# Altium schematic symbol library Library.SchLib: 802 symbols (part 4 of 8) (continued)
## EP1C6-TQFP240A (continued)
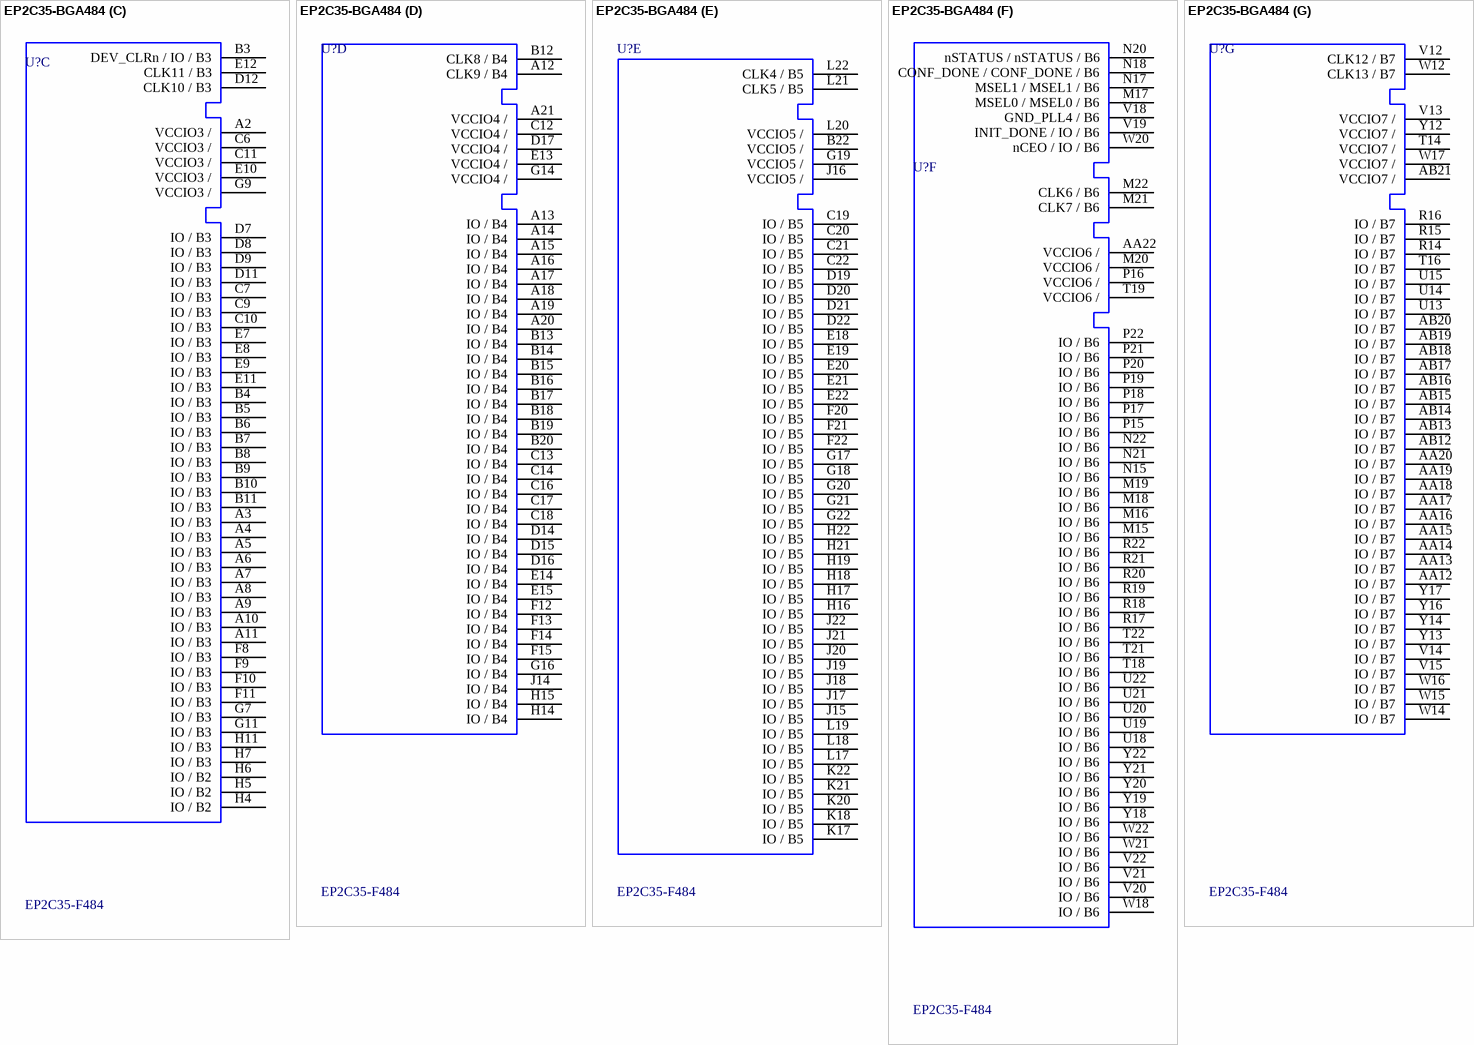
[diagram p26: symbol EP2C35-BGA484]
text: ALTERA; Cyclone

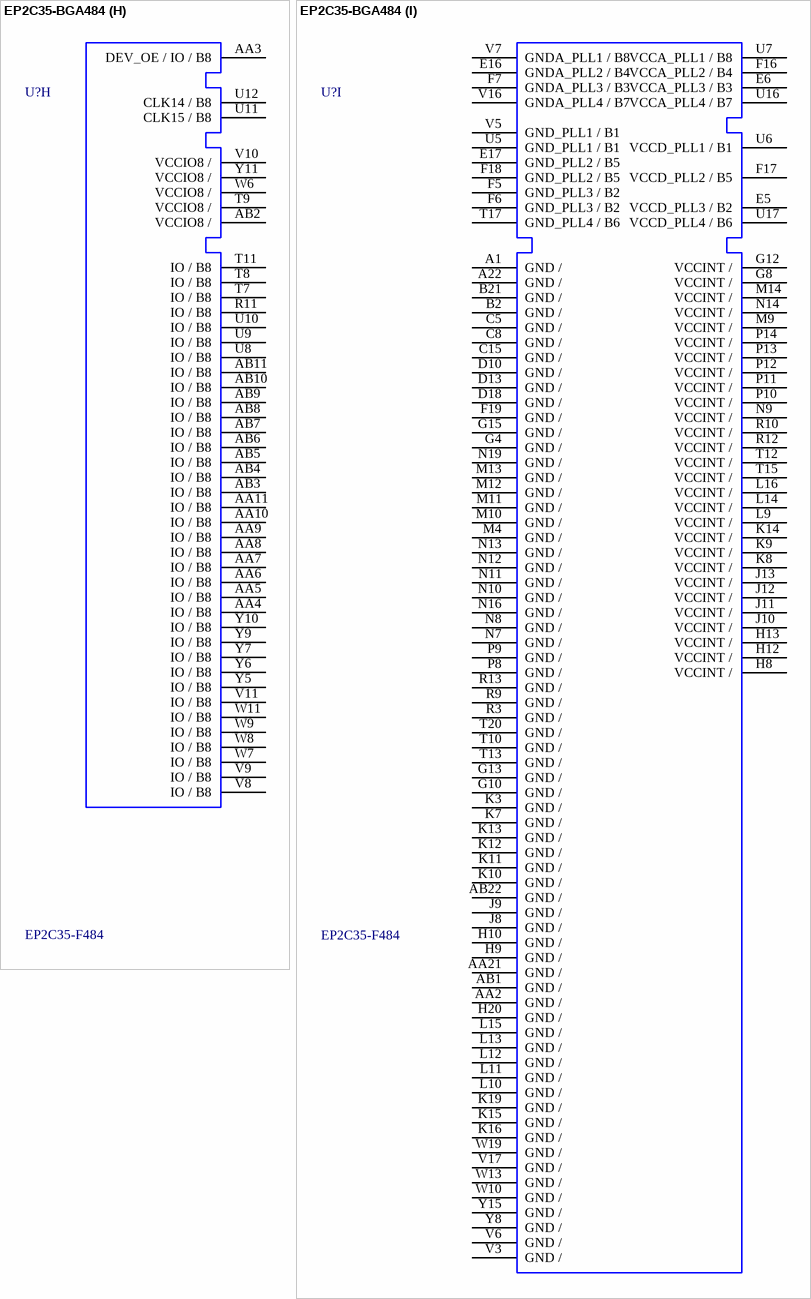
[diagram p27: symbol EP2C35-BGA484]

## EP2C35-BGA484
designator U?, comment EP2C35-F484
ALTERA 2C35 FPGA BGA484 PACKAGE; Manufacturer Part Number: EP2C35F484C8N; Number of I /O: 322; Number of Logic Blocks/Elements: 33216; Voltage - Supply: 1.15 V ~ 3.465 V; Supplier 1: Digi-Key; Supplier Part Number 1: 544-1366-ND; RoHS: RoHS Compliant; Number of Registers: -; Package / Case: 484-FBGA; Number of Gates: -; Category: Integrated Circuits (ICs); Supplier: Digi-Key; Delay Time: -; Operating Temperature: 0°C ~ 85°C; Manufacturer: Altera; Supplier Part Number: 544-1366-ND
footprint BGA484
part A pins: AA1 VCCIO1 /, M1 CLK2 / B1, M2 CLK3 / B1, M3 VCCIO1 /, M5 IO / B1, M6 IO / B1, M7 IO / B1, M8 IO / B1, N1 IO / B1, N2 IO / B1, N3 IO / B1, N4 IO / B1, N5 IO / B1, N6 IO / B1, P1 IO / B1, P2 IO / B1, P3 IO / B1, P4 IO / B1, P5 IO / B1, P6 IO / B1, P7 VCCIO1 /, R1 IO / B1, R2 IO / B1, R4 IO / B1, R5 IO / B1, R6 IO / B1, R7 IO / B1, R8 IO / B1, T1 IO / B1, T2 IO / B1, T3 IO / B1, T4 VCCIO1 /, T5 IO / B1, T6 IO / B1, U1 IO / B1, U2 IO / B1, U3 IO / B1, U4 IO / B1, V1 IO / B1, V2 IO / B1, V4 IO / B1, W1 IO / B1, W2 IO / B1, W3 IO / B1, W4 IO / B1, W5 IO / B1, Y1 IO / B1, Y2 IO / B1, Y3 IO / B1, Y4 IO / B1
part B pins: B1 VCCIO2 /, C1 IO / B2, C2 IO / B2, C3 nCSO / IO / B2, C4 ASDO / IO / B2, D1 IO / B2, D2 IO / B2, D3 CRC_ERROR / IO / B2, D4 CLKUSR / IO / B2, D5 IO / B2, D6 IO / B2, E1 IO / B2, E2 IO / B2, E3 IO / B2, E4 IO / B2, F1 IO / B2, F2 IO / B2, F3 IO / B2, F4 IO / B2, G1 IO / B2, G2 IO / B2, G3 IO / B2, G5 IO / B2, G6 IO / B2, H1 IO / B2, H2 IO / B2, H3 IO / B2, J1 IO / B2, J2 IO / B2, J3 IO / B2, J4 IO / B2, J5 IO / B2, J6 IO / B2, J7 VCCIO2 /, K1 nCE / nCE / B2, K2 TCK / TCK / B2, K4 DATA0 / DATA0 / B2, K5 TDI / TDI / B2, K6 TMS / TMS / B2, L1 CLK0 / B2, L2 CLK1 / B2, L3 VCCIO2 /, L4 nCONFIG / nCONFIG / B2, L5 TDO / TDO / B2, L6 DCLK / DCLK / B2, L7 IO / B2, L8 IO / B2
part C pins: A2 VCCIO3 /, A3 IO / B3, A4 IO / B3, A5 IO / B3, A6 IO / B3, A7 IO / B3, A8 IO / B3, A9 IO / B3, A10 IO / B3, A11 IO / B3, B3 DEV_CLRn / IO / B3, B4 IO / B3, B5 IO / B3, B6 IO / B3, B7 IO / B3, B8 IO / B3, B9 IO / B3, B10 IO / B3, B11 IO / B3, C6 VCCIO3 /, C7 IO / B3, C9 IO / B3, C10 IO / B3, C11 VCCIO3 /, D7 IO / B3, D8 IO / B3, D9 IO / B3, D11 IO / B3, D12 CLK10 / B3, E7 IO / B3, E8 IO / B3, E9 IO / B3, E10 VCCIO3 /, E11 IO / B3, E12 CLK11 / B3, F8 IO / B3, F9 IO / B3, F10 IO / B3, F11 IO / B3, G7 IO / B3, G9 VCCIO3 /, G11 IO / B3, H4 IO / B2, H5 IO / B2, H6 IO / B2, H7 IO / B3, H11 IO / B3
part D pins: A12 CLK9 / B4, A13 IO / B4, A14 IO / B4, A15 IO / B4, A16 IO / B4, A17 IO / B4, A18 IO / B4, A19 IO / B4, A20 IO / B4, A21 VCCIO4 /, B12 CLK8 / B4, B13 IO / B4, B14 IO / B4, B15 IO / B4, B16 IO / B4, B17 IO / B4, B18 IO / B4, B19 IO / B4, B20 IO / B4, C12 VCCIO4 /, C13 IO / B4, C14 IO / B4, C16 IO / B4, C17 IO / B4, C18 IO / B4, D14 IO / B4, D15 IO / B4, D16 IO / B4, D17 VCCIO4 /, E13 VCCIO4 /, E14 IO / B4, E15 IO / B4, F12 IO / B4, F13 IO / B4, F14 IO / B4, F15 IO / B4, G14 VCCIO4 /, G16 IO / B4, H14 IO / B4, H15 IO / B4, J14 IO / B4
part E pins: B22 VCCIO5 /, C19 IO / B5, C20 IO / B5, C21 IO / B5, C22 IO / B5, D19 IO / B5, D20 IO / B5, D21 IO / B5, D22 IO / B5, E18 IO / B5, E19 IO / B5, E20 IO / B5, E21 IO / B5, E22 IO / B5, F20 IO / B5, F21 IO / B5, F22 IO / B5, G17 IO / B5, G18 IO / B5, G19 VCCIO5 /, G20 IO / B5, G21 IO / B5, G22 IO / B5, H16 IO / B5, H17 IO / B5, H18 IO / B5, H19 IO / B5, H21 IO / B5, H22 IO / B5, J15 IO / B5, J16 VCCIO5 /, J17 IO / B5, J18 IO / B5, J19 IO / B5, J20 IO / B5, J21 IO / B5, J22 IO / B5, K17 IO / B5, K18 IO / B5, K20 IO / B5, K21 IO / B5, K22 IO / B5, L17 IO / B5, L18 IO / B5, L19 IO / B5, L20 VCCIO5 /, L21 CLK5 / B5, L22 CLK4 / B5
part F pins: AA22 VCCIO6 /, M15 IO / B6, M16 IO / B6, M17 MSEL0 / MSEL0 / B6, M18 IO / B6, M19 IO / B6, M20 VCCIO6 /, M21 CLK7 / B6, M22 CLK6 / B6, N15 IO / B6, N17 MSEL1 / MSEL1 / B6, N18 CONF_DONE / CONF_DONE / B6, N20 nSTATUS / nSTATUS / B6, N21 IO / B6, N22 IO / B6, P15 IO / B6, P16 VCCIO6 /, P17 IO / B6, P18 IO / B6, P19 IO / B6, P20 IO / B6, P21 IO / B6, P22 IO / B6, R17 IO / B6, R18 IO / B6, R19 IO / B6, R20 IO / B6, R21 IO / B6, R22 IO / B6, T18 IO / B6, T19 VCCIO6 /, T21 IO / B6, T22 IO / B6, U18 IO / B6, U19 IO / B6, U20 IO / B6, U21 IO / B6, U22 IO / B6, V18 GND_PLL4 / B6, V19 INIT_DONE / IO / B6, V20 IO / B6, V21 IO / B6, V22 IO / B6, W18 IO / B6, W20 nCEO / IO / B6, W21 IO / B6, W22 IO / B6, Y18 IO / B6, Y19 IO / B6, Y20 IO / B6, Y21 IO / B6, Y22 IO / B6
part G pins: AA12 IO / B7, AA13 IO / B7, AA14 IO / B7, AA15 IO / B7, AA16 IO / B7, AA17 IO / B7, AA18 IO / B7, AA19 IO / B7, AA20 IO / B7, AB12 IO / B7, AB13 IO / B7, AB14 IO / B7, AB15 IO / B7, AB16 IO / B7, AB17 IO / B7, AB18 IO / B7, AB19 IO / B7, AB20 IO / B7, AB21 VCCIO7 /, R14 IO / B7, R15 IO / B7, R16 IO / B7, T14 VCCIO7 /, T16 IO / B7, U13 IO / B7, U14 IO / B7, U15 IO / B7, V12 CLK12 / B7, V13 VCCIO7 /, V14 IO / B7, V15 IO / B7, W12 CLK13 / B7, W14 IO / B7, W15 IO / B7, W16 IO / B7, W17 VCCIO7 /, Y12 VCCIO7 /, Y13 IO / B7, Y14 IO / B7, Y16 IO / B7, Y17 IO / B7
part H pins: AA3 DEV_OE / IO / B8, AA4 IO / B8, AA5 IO / B8, AA6 IO / B8, AA7 IO / B8, AA8 IO / B8, AA9 IO / B8, AA10 IO / B8, AA11 IO / B8, AB2 VCCIO8 /, AB3 IO / B8, AB4 IO / B8, AB5 IO / B8, AB6 IO / B8, AB7 IO / B8, AB8 IO / B8, AB9 IO / B8, AB10 IO / B8, AB11 IO / B8, R11 IO / B8, T7 IO / B8, T8 IO / B8, T9 VCCIO8 /, T11 IO / B8, U8 IO / B8, U9 IO / B8, U10 IO / B8, U11 CLK15 / B8, U12 CLK14 / B8, V8 IO / B8, V9 IO / B8, V10 VCCIO8 /, V11 IO / B8, W6 VCCIO8 /, W7 IO / B8, W8 IO / B8, W9 IO / B8, W11 IO / B8, Y5 IO / B8, Y6 IO / B8, Y7 IO / B8, Y9 IO / B8, Y10 IO / B8, Y11 VCCIO8 /
part I pins: A1 GND /, A22 GND /, AA2 GND /, AA21 GND /, AB1 GND /, AB22 GND /, B2 GND /, B21 GND /, C5 GND /, C8 GND /, C15 GND /, D10 GND /, D13 GND /, D18 GND /, E5 VCCD_PLL3 / B2, E6 VCCA_PLL3 / B3, E16 GNDA_PLL2 / B4, E17 GND_PLL2 / B5, F5 GND_PLL3 / B2, F6 GND_PLL3 / B2, F7 GNDA_PLL3 / B3, F16 VCCA_PLL2 / B4, F17 VCCD_PLL2 / B5, F18 GND_PLL2 / B5, F19 GND /, G4 GND /, G8 VCCINT /, G10 GND /, G12 VCCINT /, G13 GND /, G15 GND /, H8 VCCINT /, H9 GND /, H10 GND /, H12 VCCINT /, H13 VCCINT /, H20 GND /, J8 GND /, J9 GND /, J10 VCCINT /, J11 VCCINT /, J12 VCCINT /, J13 VCCINT /, K3 GND /, K7 GND /, K8 VCCINT /, K9 VCCINT /, K10 GND /, K11 GND /, K12 GND /, K13 GND /, K14 VCCINT /, K15 GND /, K16 GND /, K19 GND /, L9 VCCINT /, L10 GND /, L11 GND /, L12 GND /, L13 GND /, L14 VCCINT /, L15 GND /, L16 VCCINT /, M4 GND /, M9 VCCINT /, M10 GND /, M11 GND /, M12 GND /, M13 GND /, M14 VCCINT /, N7 GND /, N8 GND /, N9 VCCINT /, N10 GND /, N11 GND /, N12 GND /, N13 GND /, N14 VCCINT /, N16 GND /, N19 GND /, P8 GND /, P9 GND /, P10 VCCINT /, P11 VCCINT /, P12 VCCINT /, P13 VCCINT /, P14 VCCINT /, R3 GND /, R9 GND /, R10 VCCINT /, R12 VCCINT /, R13 GND /, T10 GND /, T12 VCCINT /, T13 GND /, T15 VCCINT /, T17 GND_PLL4 / B6, T20 GND /, U5 GND_PLL1 / B1, U6 VCCD_PLL1 / B1, U7 VCCA_PLL1 / B8, U16 VCCA_PLL4 / B7, U17 VCCD_PLL4 / B6, V3 GND /, V5 GND_PLL1 / B1, V6 GND /, V7 GNDA_PLL1 / B8, V16 GNDA_PLL4 / B7, V17 GND /, W10 GND /, W13 GND /, W19 GND /, Y8 GND /, Y15 GND /

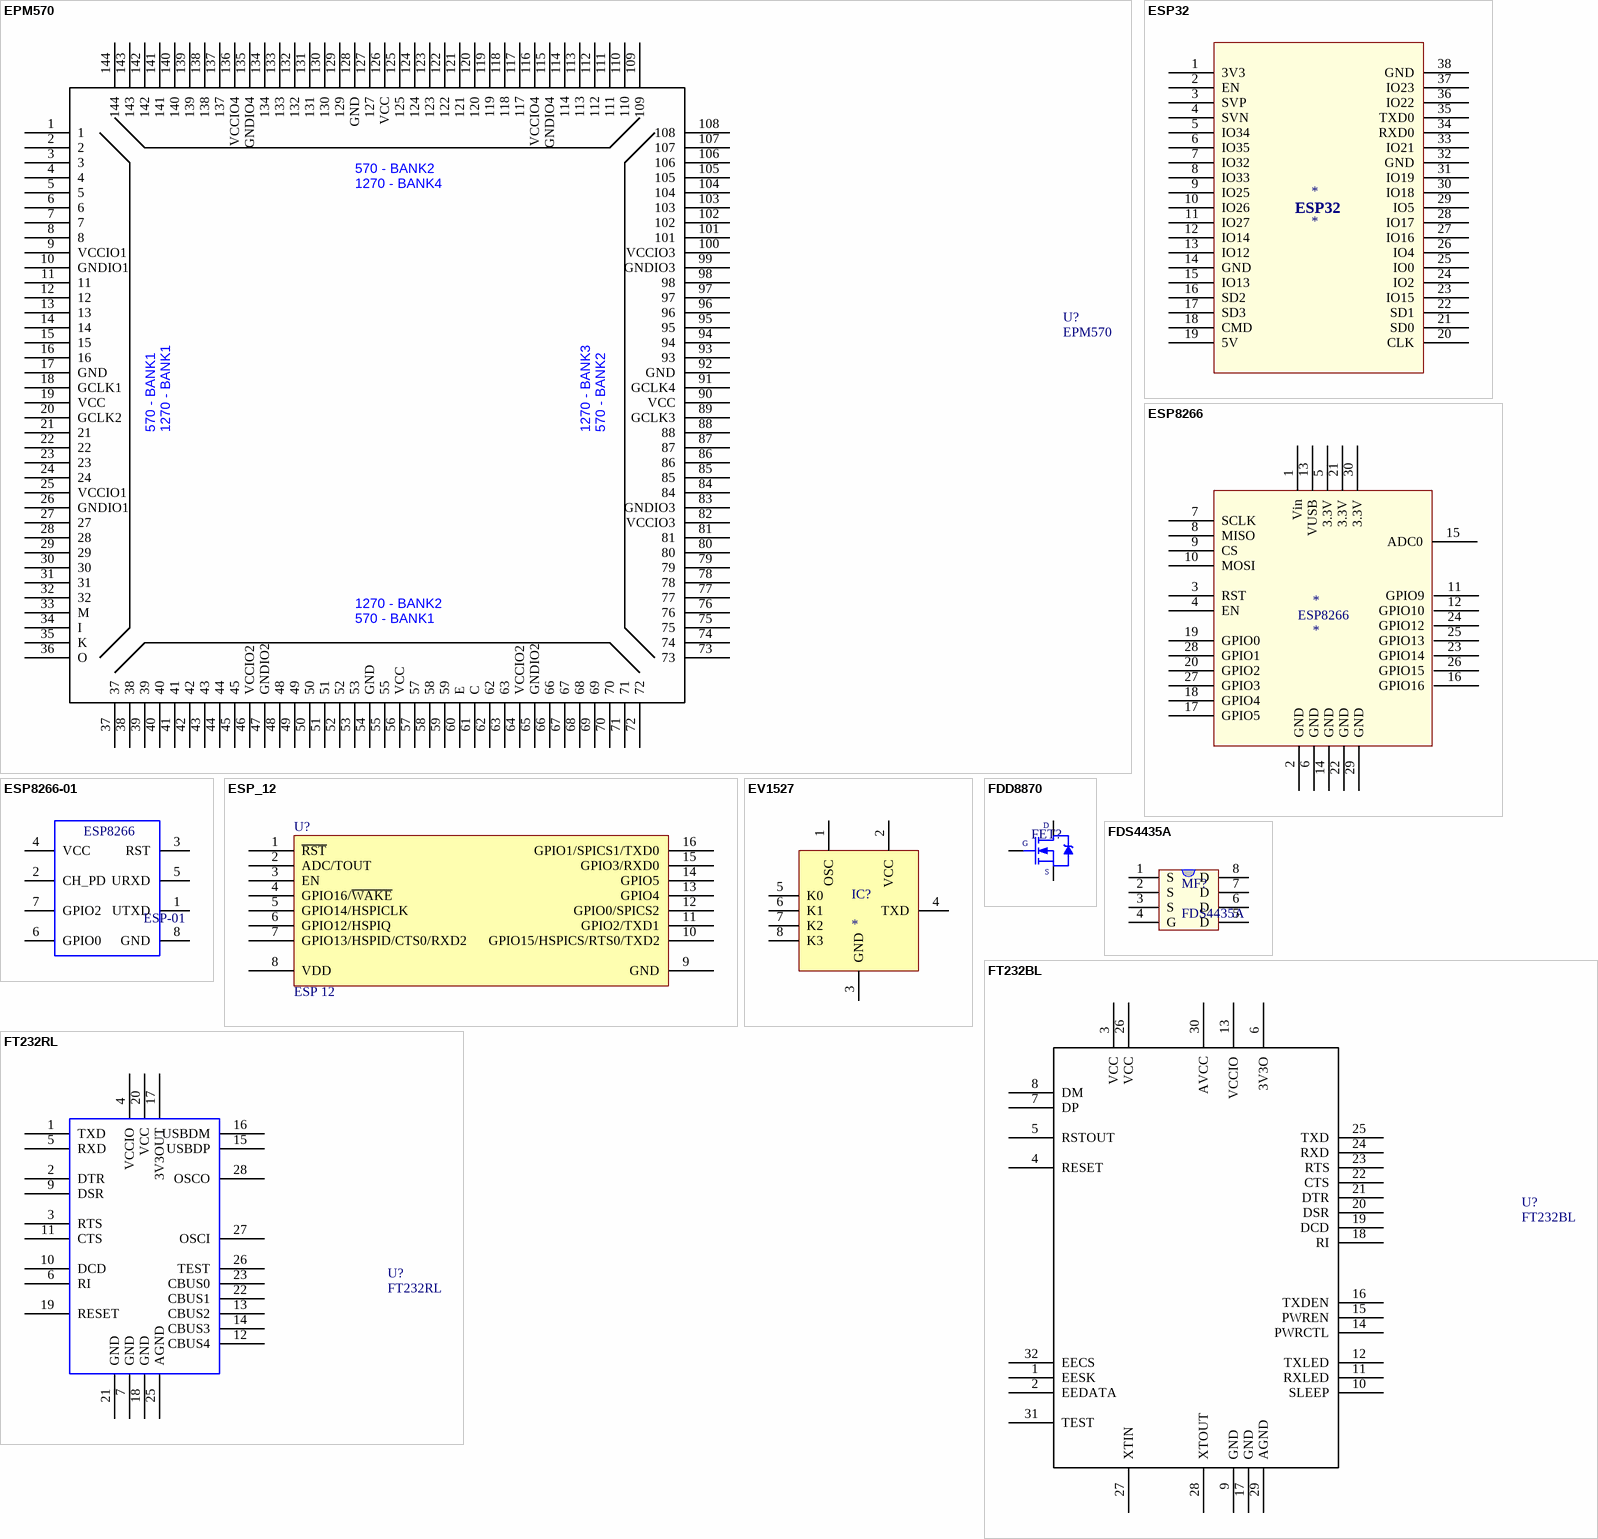
[diagram p28: symbols EPM570 to FT232RL]

## EPM570
designator U?
ALTERA EPLD; Manufacturer Part Number: EPM570T144C5N; Number of Logic Blocks/Elements: 570; Programmable Type: In System Programmable; Delay Time tpd(1) Max: 5.4nS; Voltage: 2.5V, 3.3V; Number of I /O: 116; Memory Type: FLASH; Number of Macrocells: 440; Supplier 1: Digi-Key; Supplier Part Number 1: 544-1320-ND; Operating Temperature: 0°C ~ 85°C; Packaging: Tray; Package / Case: 144-TQFP, 144-VQFP; RoHS: RoHS Compliant; Supplier: Digi-Key; Features: -; Supplier Part Number: 544-1320-ND; Manufacturer: Altera; Category: Integrated Circuits (ICs)
footprint TQFP144
pins: 1, 2, 3, 4, 5, 6, 7, 8, 9 VCCIO1, 10 GNDIO1, 11, 12, 13, 14, 15, 16, 17 GND, 18 GCLK1, 19 VCC, 20 GCLK2, 21, 22, 23, 24, 25 VCCIO1, 26 GNDIO1, 27, 28, 29, 30, 31, 32, 33 M, 34 I, 35 K, 36 O, 37, 38, 39, 40, 41, 42, 43, 44, 45, 46 VCCIO2, 47 GNDIO2, 48, 49, 50, 51, 52, 53, 54 GND, 55, 56 VCC, 57, 58, 59, 60 E, 61 C, 62, 63, 64 VCCIO2, 65 GNDIO2, 66, 67, 68, 69, 70, 71, 72, 73, 74, 75, 76, 77, 78, 79, 80, 81, 82 VCCIO3, 83 GNDIO3, 84, 85, 86, 87, 88, 89 GCLK3, 90 VCC, 91 GCLK4, 92 GND, 93, 94, 95, 96, 97, 98, 99 GNDIO3, 100 VCCIO3, 101, 102, 103, 104, 105, 106, 107, 108, 109, 110, 111, 112, 113, 114, 115 GNDIO4, 116 VCCIO4, 117, 118, 119, 120, 121, 122, 123, 124, 125, 126 VCC, 127, 128 GND, 129, 130, 131, 132, 133, 134, 135 GNDIO4, 136 VCCIO4, 137, 138, 139, 140, 141, 142, 143, 144
text: 570 - BANK2; 1270 - BANK4; 570 - BANK1; 1270 - BANK1; 1270 - BANK3; 1270 - BANK2

## ESP32
designator *
footprint ESP32
pins: 1 3V3, 2 EN, 3 SVP, 4 SVN, 5 IO34, 6 IO35, 7 IO32, 8 IO33, 9 IO25, 10 IO26, 11 IO27, 12 IO14, 13 IO12, 14 GND, 15 IO13, 16 SD2, 17 SD3, 18 CMD, 19 5V, 20 CLK, 21 SD0, 22 SD1, 23 IO15, 24 IO2, 25 IO0, 26 IO4, 27 IO16, 28 IO17, 29 IO5, 30 IO18, 31 IO19, 32 GND, 33 IO21, 34 RXD0, 35 TXD0, 36 IO22, 37 IO23, 38 GND

## ESP8266
designator *
footprint ESP8266_Big
footprint ESP8266_Small (NodeMCU)
pins: 1 Vin, 2 GND, 3 RST, 4 EN, 5 3.3V, 6 GND, 7 SCLK, 8 MISO, 9 CS, 10 MOSI, 11 GPIO9, 12 GPIO10, 13 VUSB, 14 GND, 15 ADC0, 16 GPIO16, 17 GPIO5, 18 GPIO4, 19 GPIO0, 20 GPIO2, 21 3.3V, 22 GND, 23 GPIO14, 24 GPIO12, 25 GPIO13, 26 GPIO15, 27 GPIO3, 28 GPIO1, 29 GND, 30 3.3V

## ESP8266-01
designator U?, comment ESP-01
ESP-12 Wi-Fi Module
footprint ESP8266
footprint JP4-C2T (8 pins, dual row, straight, gold plating)
pins: 1 UTXD, 2 CH_PD, 3 RST, 4 VCC, 5 URXD, 6 GPIO0, 7 GPIO2, 8 GND
text: ESP8266

## ESP_12
designator U?, comment ESP 12
ESP-12 Wi-Fi Module by AI-Thinker; IC: ESP8266-EX; Vendor: Ai-thinker
footprint ESP12
footprint ESP12_small
pins: 1 ~{RST} "Reset", 2 ADC/TOUT "ADC Input Or TOUT Output", 3 EN "Chip enable", 4 GPIO16/~{WAKE} "GPIO16 or Deep-Sleep Wakeup", 5 GPIO14/HSPICLK "GPIO14 or SPI CLK", 6 GPIO12/HSPIQ "GPIO12 or SPIQ", 7 GPIO13/HSPID/CTS0/RXD2 "GPIO13 or SPID", 8 VDD "Power supply", 9 GND "Power ground", 10 GPIO15/HSPICS/RTS0/TXD2 "GPIO15 or SPICS", 11 GPIO2/TXD1 "GPIO2 or TX", 12 GPIO0/SPICS2 "GPIO0 or SPICS2", 13 GPIO4 "GPIO5", 14 GPIO5 "GPIO4", 15 GPIO3/RXD0 "GPIO3 or UART RXD", 16 GPIO1/SPICS1/TXD0 "GPIO1 or UART TXD"

## EV1527
designator IC?
EV1527,RT1527,FP1527
footprint SO8 (SOIC, 8-Leads, Body 4.9x3.9mm, Pitch 1.27mm, IPC High Density)
pins: 1 OSC, 2 VCC, 3 GND, 4 TXD, 5 K0, 6 K1, 7 K2, 8 K3

## FDD8870
designator FET?  (value not drawn)
MOSFET N-1CH 160A 30V
footprint TO252-123
pins: 1 G, 2 D, 3 S

## FDS4435A
designator MF?
P-Channel Logic Level PowerTrench MOSFET; Value: FDS4435
footprint SO8
footprint DIP8
pins: 1 S, 2 S, 3 S, 4 G, 5 D, 6 D, 7 D, 8 D

## FT232BL
designator U?
USB TO UART INTERFACE; Manufacturer Part Number: FT232BL R; Manufacturer: FTDI, Future Technology Devices International Ltd; Voltage: 4.35 V ~ 5.25 V; FIFO's: 256 Byte; Number of Channels: 8; Supplier 1: Digi-Key; Supplier Part Number 1: 768-1009-1-ND; Supplier: Digi-Key; Features: Serial Interface; Packaging: Cut Tape (CT); Package / Case: 32-LQFP; Supplier Part Number: 768-1009-1-ND; Category: Integrated Circuits (ICs); RoHS: RoHS Compliant
footprint TQFP32 (Thin QFP, 32-Leads, Body 9x9mm, Pitch 0.8mm, IPC Low Density)
pins: 1 EESK, 2 EEDATA, 3 VCC, 4 RESET, 5 RSTOUT, 6 3V3O, 7 DP, 8 DM, 9 GND, 10 SLEEP, 11 RXLED, 12 TXLED, 13 VCCIO, 14 PWRCTL, 15 PWREN, 16 TXDEN, 17 GND, 18 RI, 19 DCD, 20 DSR, 21 DTR, 22 CTS, 23 RTS, 24 RXD, 25 TXD, 26 VCC, 27 XTIN, 28 XTOUT, 29 AGND, 30 AVCC, 31 TEST, 32 EECS

## FT232RL
designator U?
USB TO UART INTERFACE; Manufacturer: FTDI, Future Technology Devices International Ltd; Manufacturer Part Number: FT232RL R; Number of Channels: 8; Voltage: 3.3 V ~ 5.25 V; FIFO's: 256 Byte; Supplier 1: Digi-Key; Supplier Part Number 1: 768-1007-2-ND; RoHS: RoHS Compliant; Features: Serial Interface; Package / Case: 28-SSOP; Supplier: Digi-Key; Packaging: Tape & Reel (TR); Supplier Part Number: 768-1007-2-ND; Category: Integrated Circuits (ICs)
footprint TSSOP28
pins: 1 TXD, 2 DTR, 3 RTS, 4 VCCIO, 5 RXD, 6 RI, 7 GND, 9 DSR, 10 DCD, 11 CTS, 12 CBUS4, 13 CBUS2, 14 CBUS3, 15 USBDP, 16 USBDM, 17 3V3OUT, 18 GND, 19 RESET, 20 VCC, 21 GND, 22 CBUS1, 23 CBUS0, 25 AGND, 26 TEST, 27 OSCI, 28 OSCO

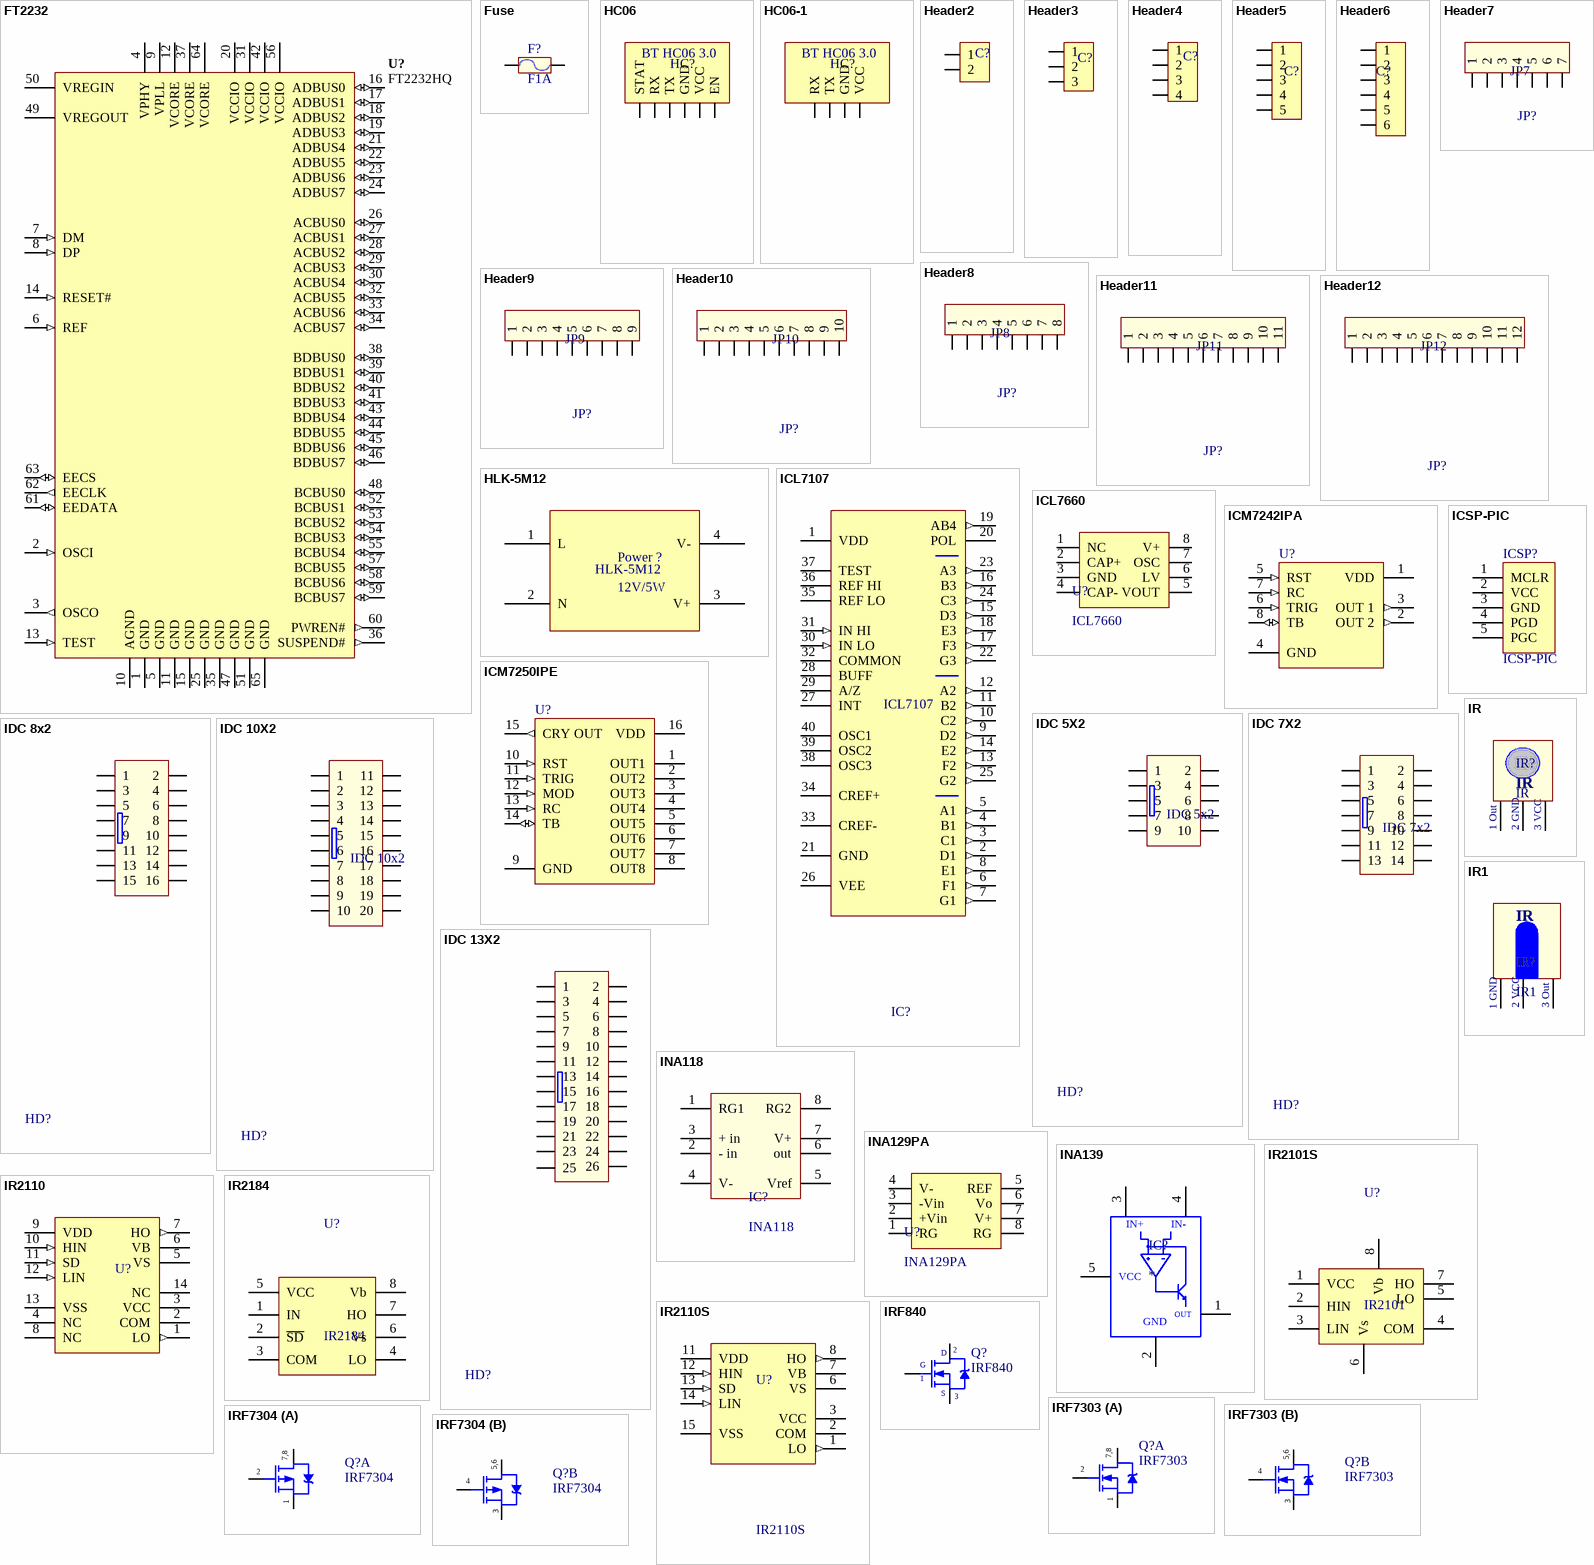
[diagram p29: symbols FT2232 to IRF7304]

## FT2232
designator U?, comment FT2232HQ
Dual High Speed USB To Multipurpose UART/FIFO IC, QFN-64, Tray; DatasheetVersion: ver 2.10, Nov-2010; ComponentLink1Description: Manufacturer URL; PackageVersion: 2010; ComponentLink1URL: http://www.ftdichip.com/; PackageReference: QFN64_2; PackageDescription: 64-Pin Quad Flat No-Lead, 9 x 9 mm Body, 0.5 mm Pitch, 4.35 x 4.35 mm Exposed Pad; RevisionNote: URLs added.; ComponentLink2URL: http://www.ftdichip.com/Support/Documents/DataSheets/ICs/DS_FT2232H.pdf; ComponentLink2Description: Datasheet
footprint QFN64M (QFN, 64-Leads, Body 9x9mm, Pitch 0.5mm, IPC High Density)
pins: 1 GND (power), 2 OSCI (in), 3 OSCO (out), 4 VPHY (power), 5 GND (power), 6 REF (in), 7 DM (in), 8 DP (in), 9 VPLL (power), 10 AGND (power), 11 GND (power), 12 VCORE (power), 13 TEST (in), 14 RESET# (in), 15 GND (power), 16 ADBUS0 (io), 17 ADBUS1 (io), 18 ADBUS2 (io), 19 ADBUS3 (io), 20 VCCIO (power), 21 ADBUS4 (io), 22 ADBUS5 (io), 23 ADBUS6 (io), 24 ADBUS7 (io), 25 GND (power), 26 ACBUS0 (io), 27 ACBUS1 (io), 28 ACBUS2 (io), 29 ACBUS3 (io), 30 ACBUS4 (io), 31 VCCIO (power), 32 ACBUS5 (io), 33 ACBUS6 (io), 34 ACBUS7 (io), 35 GND (power), 36 SUSPEND# (out), 37 VCORE (power), 38 BDBUS0 (io), 39 BDBUS1 (io), 40 BDBUS2 (io), 41 BDBUS3 (io), 42 VCCIO (power), 43 BDBUS4 (io), 44 BDBUS5 (io), 45 BDBUS6 (io), 46 BDBUS7 (io), 47 GND (power), 48 BCBUS0 (io), 49 VREGOUT (power), 50 VREGIN (power), 51 GND (power), 52 BCBUS1 (io), 53 BCBUS2 (io), 54 BCBUS3 (io), 55 BCBUS4 (io), 56 VCCIO (power), 57 BCBUS5 (io), 58 BCBUS6 (io), 59 BCBUS7 (io), 60 PWREN# (out), 61 EEDATA (io), 62 EECLK (out), 63 EECS (io), 64 VCORE (power), 65 GND (power)

## Fuse
designator F?, comment F1A
Fuse; Designed by: VanDungEvn; Value: Fuse
footprint Fuse4 (FUSEHOLDER BLOCKS - PCB - CLIP COVER - THT - WR-FSH)
footprint Fuse1
footprint FUSE2 (De Fuse)
footprint Fuse5 (PCB - Clip Cover - THR)
footprint Fuse3 (FUSEHOLDER BLOCKS - PCB - CLIP COVER - THT - WR-FSH)
footprint Fuse6 (FUSEHOLDER BLOCKS - PCB - CLIP COVER - THT - WR-FSH)
footprint Fuse7 (FUSEHOLDER BLOCKS - PCB - CLIP COVER - THT - WR-FSH)
footprint Fuse8 (WR-FSH Shocksafe Fuseholder-PCB-Turn and Lock Cover-THT)
footprint Fuse9 (WR-FSH Shocksafe Fuseholder-PCB-Turn and Lock Cover-THT)
footprint FUSE_1206
footprint FUSE_2515
footprint FUSE_XEMAY
footprint FUSE_DIP
pins: 1, 2

## HC06
designator HC?
Manufacturer: W¨¹rth Elektronik eiSos GmbH; partNo: 613004143121; ComponentLink1 Description: Manufacturer; ComponentLink2 Description: Datasheet; NoPins: 04; Created Date: 29 March 2013; ComponentLink1URL: http://www.we-online.com; ComponentLink2URL: http://katalog.we-online.de/em/datasheet/6130xx143121.pdf; Created by: Karrer Zheng
footprint HC06
footprint JP6-C1T (6 row, straight, gold plating)
pins: 1 STAT, 2 RX, 3 TX, 4 GND, 5 VCC, 6 EN
text: BT HC06 3.0

## HC06-1
designator HC?
Manufacturer: W¨¹rth Elektronik eiSos GmbH; partNo: 613004143121; ComponentLink1 Description: Manufacturer; ComponentLink2 Description: Datasheet; NoPins: 04; Created Date: 29 March 2013; ComponentLink1URL: http://www.we-online.com; ComponentLink2URL: http://katalog.we-online.de/em/datasheet/6130xx143121.pdf; Created by: Karrer Zheng
footprint HC06-1
footprint JP4-C1T (4 row, straight, gold plating)
pins: 1 RX, 2 TX, 3 GND, 4 VCC
text: BT HC06 3.0

## Header2
designator C?
Header IDC, 2 x 1 Pin Vertical 2.54mm Pitch (Non-Boxed, Male); Manufacturer: W¨¹rth Elektronik eiSos GmbH; partNo: 613002143121; ComponentLink1 Description: Manufacturer; ComponentLink2 Description: Datasheet; NoPins: 02; Created Date: 29 March 2013; ComponentLink1URL: http://www.we-online.com; ComponentLink2URL: http://katalog.we-online.de/em/datasheet/6130xx143121.pdf; Created by: Karrer Zheng
footprint HDR2 (Connector; Header; 2 Position)
footprint Header2 (CON2)
footprint Header2N (CON2)
footprint 0353630260 (CONN HEADER R/A 2POS 2MM)
pins: 1, 2

## Header3
designator C?
Header IDC, 3 x 1 Pin Vertical 2.54mm Pitch (Non-Boxed, Male); Manufacturer: W¨¹rth Elektronik eiSos GmbH; partNo: 613002143121; ComponentLink1 Description: Manufacturer; ComponentLink2 Description: Datasheet; NoPins: 02; Created Date: 29 March 2013; ComponentLink1URL: http://www.we-online.com; ComponentLink2URL: http://katalog.we-online.de/em/datasheet/6130xx143121.pdf; Created by: Karrer Zheng
footprint HDR3 (Connector; Header; 3 Position)
footprint Header3 (CON 3)
footprint Header3N (CON 3)
pins: 1, 2, 3

## Header4
designator C?
Header IDC, 4 x 1 Pin Vertical 2.54mm Pitch (Non-Boxed, Male); Manufacturer: W¨¹rth Elektronik eiSos GmbH; partNo: 613002143121; ComponentLink1 Description: Manufacturer; ComponentLink2 Description: Datasheet; NoPins: 02; Created Date: 29 March 2013; ComponentLink1URL: http://www.we-online.com; ComponentLink2URL: http://katalog.we-online.de/em/datasheet/6130xx143121.pdf; Created by: Karrer Zheng
footprint HDR4 (Connector; Header; 4 Position)
footprint Header4 (CON4)
footprint Header4N (CON4)
pins: 1, 2, 3, 4

## Header5
designator C?
Header IDC, 5 x 1 Pin Vertical 2.54mm Pitch (Non-Boxed, Male); Manufacturer: W¨¹rth Elektronik eiSos GmbH; partNo: 613002143121; ComponentLink1 Description: Manufacturer; ComponentLink2 Description: Datasheet; NoPins: 02; Created Date: 29 March 2013; ComponentLink1URL: http://www.we-online.com; ComponentLink2URL: http://katalog.we-online.de/em/datasheet/6130xx143121.pdf; Created by: Karrer Zheng
footprint HDR5 (Connector; Header; 5 Position)
footprint Header5 (CON5)
footprint Header5N (CON5)
pins: 1, 2, 3, 4, 5

## Header6
designator C?
Header IDC, 6 x 1 Pin Vertical 2.54mm Pitch (Non-Boxed, Male); Manufacturer: W¨¹rth Elektronik eiSos GmbH; partNo: 613002143121; ComponentLink1 Description: Manufacturer; ComponentLink2 Description: Datasheet; NoPins: 02; Created Date: 29 March 2013; ComponentLink1URL: http://www.we-online.com; ComponentLink2URL: http://katalog.we-online.de/em/datasheet/6130xx143121.pdf; Created by: Karrer Zheng
footprint HDR6 (Connector; Header; 6 Position)
footprint Header6 (CON6)
footprint Header6N (CON6)
pins: 1, 2, 3, 4, 5, 6

## Header7
designator JP?, comment JP7
Connector 7; Value: Connector 7
footprint Header7 (CON7)
footprint Header7N (CON7)
pins: 1, 2, 3, 4, 5, 6, 7

## Header8
designator JP?, comment JP8
Connector 8; Value: Connector 8
footprint Header8 (CON8)
footprint Header8N (CON8)
pins: 1, 2, 3, 4, 5, 6, 7, 8

## Header9
designator JP?, comment JP9
Connector 9; Value: Connector 9
footprint Header9 (CON9)
footprint Header9N (CON9)
pins: 1, 2, 3, 4, 5, 6, 7, 8, 9

## Header10
designator JP?, comment JP10
Connector 10; Value: Connector 10
footprint Header10 (CON10)
footprint Header10N (CON10)
pins: 1, 2, 3, 4, 5, 6, 7, 8, 9, 10

## Header11
designator JP?, comment JP11
Connector 11; Value: Connector 11
footprint Header11 (CON11)
footprint Header11N (CON11)
pins: 1, 2, 3, 4, 5, 6, 7, 8, 9, 10, 11

## Header12
designator JP?, comment JP12
Connector 12; Value: Connector 12
footprint Header12 (CON12)
footprint Header12N (CON12)
pins: 1, 2, 3, 4, 5, 6, 7, 8, 9, 10, 11, 12

## HLK-5M12
designator Power ?, comment 12V/5W
HLK-5M12  AC/DC 12V/5W
footprint HLK-5M12 (12V/5W)
pins: 1 L (power), 2 N (power), 3 V+, 4 V-

## ICL7107
designator IC?
Dipslay voltage 0 - 1999; Value: ICL7107
footprint DIP40/W0.6 (40 PIN, W 600mil, Pin to pin 100mil)
pins: 1 VDD (power), 2 D1 (out), 3 C1 (out), 4 B1 (out), 5 A1 (out), 6 F1 (out), 7 G1 (out), 8 E1 (out), 9 D2 (out), 10 C2 (out), 11 B2 (out), 12 A2 (out), 13 F2 (out), 14 E2 (out), 15 D3 (out), 16 B3 (out), 17 F3 (out), 18 E3 (out), 19 AB4 (out), 20 POL, 21 GND (power), 22 G3 (out), 23 A3 (out), 24 C3 (out), 25 G2 (out), 26 VEE (power), 27 INT, 28 BUFF, 29 A/Z, 30 IN LO (in), 31 IN HI (in), 32 COMMON, 33 CREF-, 34 CREF+, 35 REF LO, 36 REF HI, 37 TEST, 38 OSC3, 39 OSC2, 40 OSC1

## ICL7660
designator U?
CMOS Voltage Converters; Creator: Nguyen Ba Bien
footprint DIP8
footprint SO8 (SOIC, 8-Leads, Body 4.9x3.9mm, Pitch 1.27mm, IPC High Density)
pins: 1 NC, 2 CAP+, 3 GND, 4 CAP-, 5 VOUT, 6 LV, 7 OSC, 8 V+